# Altium footprint library Footprints_SOC.PcbLib: 201 footprints (part 7 of 13)
Each footprint in its own frame and in the unit in brackets; x right, y up, seen from the top. Pads: shape width x height; smd on the part's side, far side on the other; paste and mask are expansions set on the pad; w line width, h text height; cw(c..) or ccw(c..) is an arc to the next point about the centre after c.
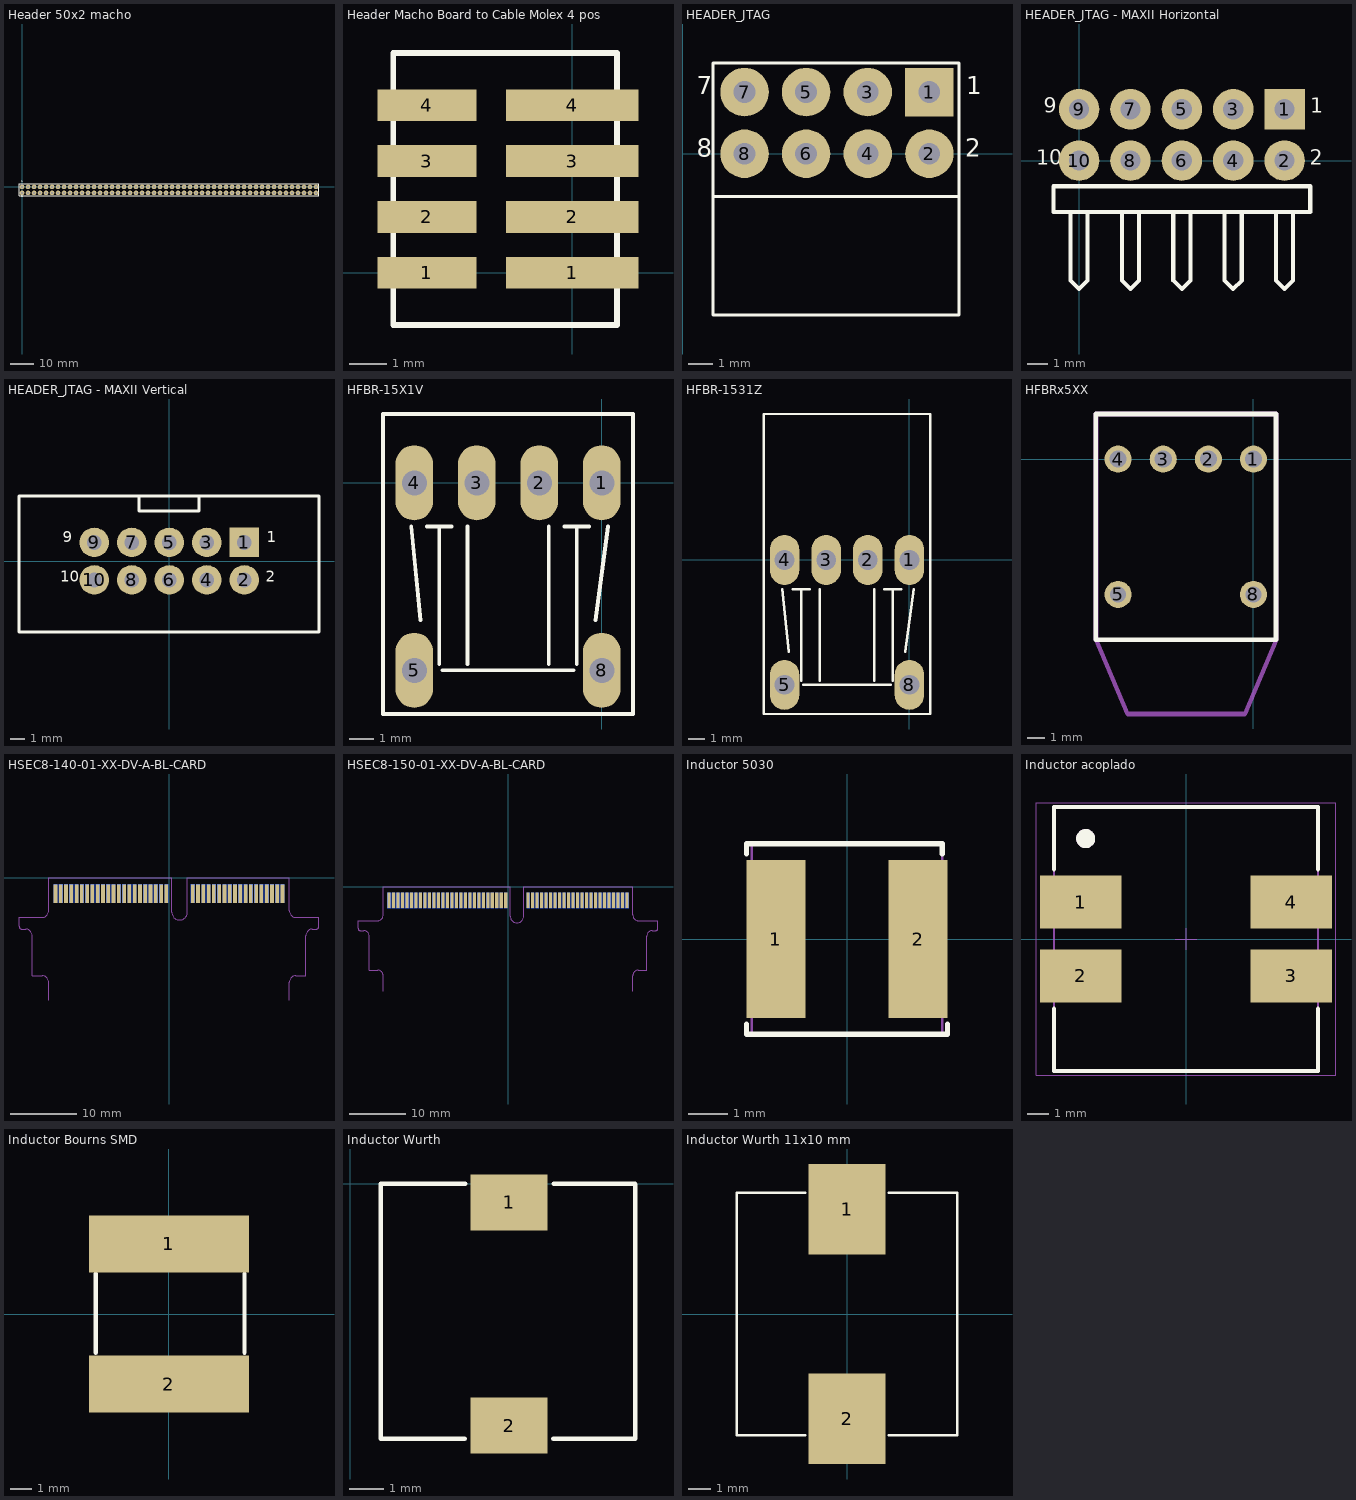
[diagram p6: the footprints below, top view; thin cyan lines are the x and y axes]

## Header 50x2 macho [mm]
pads (100):
  round 2 hole 0.9: 1(0,0) 2(0,-2.54) 3(2.54,0) 4(2.54,-2.54) 5(5.08,0) 6(5.08,-2.54) 7(7.62,0) 8(7.62,-2.54) 9(10.16,0) 10(10.16,-2.54) 11(12.7,0) 12(12.7,-2.54) 13(15.24,0) 14(15.24,-2.54) 15(17.78,0) 16(17.78,-2.54) 17(20.32,0) 18(20.32,-2.54) 19(22.86,0) 20(22.86,-2.54) 21(25.4,0) 22(25.4,-2.54) 23(27.94,0) 24(27.94,-2.54) 25(30.48,0) 26(30.48,-2.54) 27(33.02,0) 28(33.02,-2.54) 29(35.56,0) 30(35.56,-2.54) 31(38.1,0) 32(38.1,-2.54) 33(40.64,0) 34(40.64,-2.54) 35(43.18,0) 36(43.18,-2.54) 37(45.72,0) 38(45.72,-2.54) 39(48.26,0) 40(48.26,-2.54) 41(50.8,0) 42(50.8,-2.54) 43(53.34,0) 44(53.34,-2.54) 45(55.88,0) 46(55.88,-2.54) 47(58.42,0) 48(58.42,-2.54) 49(60.96,0) 50(60.96,-2.54) 51(63.5,0) 52(63.5,-2.54) 53(66.04,0) 54(66.04,-2.54) 55(68.58,0) 56(68.58,-2.54) 57(71.12,0) 58(71.12,-2.54) 59(73.66,0) 60(73.66,-2.54) 61(76.2,0) 62(76.2,-2.54) 63(78.74,0) 64(78.74,-2.54) 65(81.28,0) 66(81.28,-2.54) 67(83.82,0) 68(83.82,-2.54) 69(86.36,0) 70(86.36,-2.54) 71(88.9,0) 72(88.9,-2.54) 73(91.44,0) 74(91.44,-2.54) 75(93.98,0) 76(93.98,-2.54) 77(96.52,0) 78(96.52,-2.54) 79(99.06,0) 80(99.06,-2.54) 81(101.6,0) 82(101.6,-2.54) 83(104.14,0) 84(104.14,-2.54) 85(106.68,0) 86(106.68,-2.54) 87(109.22,0) 88(109.22,-2.54) 89(111.76,0) 90(111.76,-2.54) 91(114.3,0) 92(114.3,-2.54) 93(116.84,0) 94(116.84,-2.54) 95(119.38,0) 96(119.38,-2.54) 97(121.92,0) 98(121.92,-2.54) 99(124.46,0) 100(124.46,-2.54)
Top Overlay:
  lines w0.1: -1.29,-3.74 125.73,-3.74 125.73,1.27 -1.29,1.27 -1.29,-3.74
  text "1" at -0.37,1.45 h1.52
  text "2" at -0.37,-4.79 h1.52
3D body "header 50x2 macho.stp": height 33.53, standoff -2.79, extent -1.28,-3.81 125.72,1.27

## Header Macho Board to Cable Molex 4 pos [mm] "P/N: 0874370443"
pads (8):
  rect 2.65x0.85 smd: 1(-3.9,0) 2(-3.9,1.5) 3(-3.9,3) 4(-3.9,4.5)
  rect 3.55x0.85 smd: 1(0,0) 2(0,1.5) 3(0,3) 4(0,4.5)
Top Overlay:
  lines w0.15: -4.8,-1.4 -4.8,5.9 1.2,5.9 1.2,-1.4 -4.8,-1.4
3D body "874370443.stp": height 5.87, standoff 0.12, extent -4.8,-1.4 1.2,5.9

## HEADER_JTAG [mm] "Connector; Header; 5x2 Position; Right Angle"
pads (8):
  rect 2x2 hole 0.9: 1(10.16,2.54)
  round 2 hole 0.9: 2(10.16,0) 3(7.62,2.54) 4(7.62,0) 5(5.08,2.54) 6(5.08,0) 7(2.54,2.54) 8(2.54,0)
Top Overlay:
  lines w0.127: 1.24,-1.76 11.38,-1.76 ; 1.24,-6.65 1.24,3.73 1.25,3.74 11.38,3.74 11.38,-6.65 1.24,-6.65
  text "8" at 0.58,-0.37 h1.27
  text "7" at 0.58,2.205 h1.27
  text "1" at 11.68,2.2 h1.27
  text "2" at 11.643,-0.37 h1.27
3D body "header 4x2 angulo recto.stp": height 7.18, standoff -5.58, extent 1.24,-6.66 11.4,3.729

## HEADER_JTAG - MAXII Horizontal [mm] "Connector; Header; 5x2 Position; Right Angle"
pads (10):
  rect 2x2 hole 1: 1(10.16,2.54)
  round 2 hole 1: 2(10.16,0) 3(7.62,2.54) 4(7.62,0) 5(5.08,2.54) 6(5.08,0) 7(2.54,2.54) 8(2.54,0) 9(0,2.54) 10(0,0)
Top Overlay:
  lines w0.2: -0.423,-2.54 -0.423,-5.927 0,-6.35 0.423,-5.927 0.423,-2.54 ; 2.117,-2.54 2.117,-5.927 2.54,-6.35 2.963,-5.927 2.963,-2.54 ; 4.657,-2.54 4.657,-5.927 5.08,-6.35 5.503,-5.927 5.503,-2.54 ; 7.197,-2.54 7.197,-5.927 7.62,-6.35 8.043,-5.927 8.043,-2.54 ; 9.737,-2.54 9.737,-5.927 10.16,-6.35 10.583,-5.927 10.583,-2.54 ; -1.27,-2.54 -1.27,-1.27 11.43,-1.27 11.43,-2.54 -1.27,-2.54
  text "10" at -2.13,-0.457 h1.27
  text "9" at -1.744,2.118 h1.27
  text "1" at 11.432,2.125 h1.27
  text "2" at 11.395,-0.457 h1.27
3D body "918143110.stp": height 9.87, standoff -1.97, extent -2.44,-10.644 12.6,2.8

## HEADER_JTAG - MAXII Vertical [mm] "Connector; Header; 5x2 Position"
pads (10):
  rect 2x2 hole 1: 1(5.08,1.27)
  round 2 hole 1: 2(5.08,-1.27) 3(2.54,1.27) 4(2.54,-1.27) 5(0,1.27) 6(0,-1.27) 7(-2.54,1.27) 8(-2.54,-1.27) 9(-5.08,1.27) 10(-5.08,-1.27)
Top Overlay:
  lines w0.2: -2.05,4.417 -2.05,3.4 2.014,3.4 2.014,4.417 ; -10.178,-4.801 -10.178,4.417 10.142,4.417 10.142,-4.801 -10.178,-4.801
  text "10" at -7.38,-1.67 h1.27
  text "9" at -7.2,1 h1.27
  text "1" at 6.62,1.007 h1.27
  text "2" at 6.52,-1.67 h1.27
3D body "Header JTAG CPLD MAXII Vertical.STEP": height 9.41, standoff -2.8, extent -10.178,-4.801 10.142,4.417

## HFBR-15X1V [mil] "Transmisor fibra Optica Horizontal"
pads (6):
  oval 60x120 hole 40: 1(0,0) 2(-100,0) 3(-200,0) 4(-300,0) 5(-300,-300) 8(0,-300)
Top Overlay:
  lines w6: -305,-70 -290,-220 ; -280,-70 -260,-70 ; -260,-290 -260,-70 ; -255,-300 -45,-300 ; -240,-70 -260,-70 ; -215,-290 -215,-70 ; -85,-290 -85,-70 ; -60,-70 -40,-70 ; -40,-290 -40,-70 ; -20,-70 -40,-70 ; -10,-220 10,-70 ; -350,-370 -350,-103.33 -350,110 50,110 50,-370 -5,-370 -295,-370 -350,-370
Mechanical 16:
  lines w6: -295,-340 -295,-260 ; -225,30 -215,30 ; -5,-340 -5,-260
3D body "HFBR2521 (Tx Fibra ootica).STEP": height 300, standoff -124.8, extent -350.31,-630.16 130,110

## HFBR-1531Z [mm] "Emisor fibra optica Vertical"
pads (6):
  oval 1.8x3.048 hole 1.2: 1(0,0) 2(-2.54,0) 3(-5.08,0) 4(-7.62,0) 5(-7.62,-7.62) 8(0,-7.62)
Top Overlay:
  lines w0.152: -7.747,-1.778 -7.366,-5.588 ; -7.112,-1.778 -6.604,-1.778 ; -6.604,-7.366 -6.604,-1.778 ; -6.477,-7.62 -1.143,-7.62 ; -6.096,-1.778 -6.604,-1.778 ; -5.461,-7.366 -5.461,-1.778 ; -2.159,-7.366 -2.159,-1.778 ; -1.524,-1.778 -1.016,-1.778 ; -1.016,-7.366 -1.016,-1.778 ; -0.508,-1.778 -1.016,-1.778 ; -0.254,-5.588 0.254,-1.778 ; -8.89,-9.398 -8.89,-2.625 -8.89,8.9 1.27,8.9 1.27,-9.398 -0.127,-9.398 -7.493,-9.398 -8.89,-9.398
Mechanical 16:
  lines w0.152: -7.493,-8.636 -7.493,-6.604 ; -5.715,0.762 -5.461,0.762 ; -0.127,-8.636 -0.127,-6.604
3D body "HFBR-0500Z Series (Tx Fibr optica Vertical).stp": height 18.8, standoff -3.3, extent -8.988,-9.45 3.202,8.84

## HFBRx5XX [mil]
pads (6):
  round 60 hole 38: 1(0,0) 2(-100,0) 3(-200,0) 4(-300,0)
  round 60 hole 35: 5(-300,-300) 8(0,-300)
Top Overlay:
  lines w10: -350,-400 -350,100 50,100 50,-400 -350,-400
Top Assembly:
  lines w10: -349,-400 -349,100 51,100 51,-400 -19,-565 -279,-565 -349,-400
  text ".Designator" at -352,-201 h40
3D body "Avago HFBR-0500ETZ Series.stp": height 343.94, standoff -100.16, extent -349.96,-610 129.96,130.12

## HSEC8-140-01-XX-DV-A-BL-CARD [mm]
pads (80):
  rect 0.55x2.8 smd far side mask+0.05: 1(-17.2,-2.4) 3(-16.4,-2.4) 5(-15.6,-2.4) 7(-14.8,-2.4) 9(-14,-2.4) 11(-13.2,-2.4) 13(-12.4,-2.4) 15(-11.6,-2.4) 17(-10.8,-2.4) 19(-10,-2.4) 21(-9.2,-2.4) 23(-8.4,-2.4) 25(-7.6,-2.4) 27(-6.8,-2.4) 29(-6,-2.4) 31(-5.2,-2.4) 33(-4.4,-2.4) 35(-3.6,-2.4) 37(-2.8,-2.4) 39(-2,-2.4) 41(-1.2,-2.4) 43(-0.4,-2.4) 45(3.6,-2.4) 47(4.4,-2.4) 49(5.2,-2.4) 51(6,-2.4) 53(6.8,-2.4) 55(7.6,-2.4) 57(8.4,-2.4) 59(9.2,-2.4) 61(10,-2.4) 63(10.8,-2.4) 65(11.6,-2.4) 67(12.4,-2.4) 69(13.2,-2.4) 71(14,-2.4) 73(14.8,-2.4) 75(15.6,-2.4) 77(16.4,-2.4) 79(17.2,-2.4)
  rect 0.55x2.8 smd mask+0.05: 2(-17.2,-2.4) 4(-16.4,-2.4) 6(-15.6,-2.4) 8(-14.8,-2.4) 10(-14,-2.4) 12(-13.2,-2.4) 14(-12.4,-2.4) 16(-11.6,-2.4) 18(-10.8,-2.4) 20(-10,-2.4) 22(-9.2,-2.4) 24(-8.4,-2.4) 26(-7.6,-2.4) 28(-6.8,-2.4) 30(-6,-2.4) 32(-5.2,-2.4) 34(-4.4,-2.4) 36(-3.6,-2.4) 38(-2.8,-2.4) 40(-2,-2.4) 42(-1.2,-2.4) 44(-0.4,-2.4) 46(3.6,-2.4) 48(4.4,-2.4) 50(5.2,-2.4) 52(6,-2.4) 54(6.8,-2.4) 56(7.6,-2.4) 58(8.4,-2.4) 60(9.2,-2.4) 62(10,-2.4) 64(10.8,-2.4) 66(11.6,-2.4) 68(12.4,-2.4) 70(13.2,-2.4) 72(14,-2.4) 74(14.8,-2.4) 76(15.6,-2.4) 78(16.4,-2.4) 80(17.2,-2.4)
Mechanical 16:
  lines w0.025: -18.225,-18.566 -18.225,-15.84 ccw(c-19.225,-15.84) -19.225,-14.84 -20.725,-14.84 -20.725,-8.78 ccw(c-21.725,-8.78) -21.725,-7.78 -22.325,-7.78 cw(c-22.325,-7.38) -22.725,-7.38 -22.725,-6 -19.225,-6 ccw(c-19.225,-5) -18.225,-5 -18.225,-0.779 -18.225,0 0.4,0 0.4,-0.779 0.4,-5.2 ccw(c1.6,-5.2) 2.8,-5.2 2.8,-0.779 2.8,0 18.225,0 18.225,-0.779 18.225,-5 ccw(c19.225,-5) 19.225,-6 22.725,-6 22.725,-7.38 cw(c22.325,-7.38) 22.325,-7.78 21.725,-7.78 ccw(c21.725,-8.78) 20.725,-8.78 20.725,-14.84 19.225,-14.84 ccw(c19.225,-15.84) 18.225,-15.84 18.225,-18.566

## HSEC8-150-01-XX-DV-A-BL-CARD [mm]
pads (100):
  rect 0.55x2.8 smd far side mask+0.05: 1(-21.2,-2.4) 3(-20.4,-2.4) 5(-19.6,-2.4) 7(-18.8,-2.4) 9(-18,-2.4) 11(-17.2,-2.4) 13(-16.4,-2.4) 15(-15.6,-2.4) 17(-14.8,-2.4) 19(-14,-2.4) 21(-13.2,-2.4) 23(-12.4,-2.4) 25(-11.6,-2.4) 27(-10.8,-2.4) 29(-10,-2.4) 31(-9.2,-2.4) 33(-8.4,-2.4) 35(-7.6,-2.4) 37(-6.8,-2.4) 39(-6,-2.4) 41(-5.2,-2.4) 43(-4.4,-2.4) 45(-3.6,-2.4) 47(-2.8,-2.4) 49(-2,-2.4) 51(-1.2,-2.4) 53(-0.4,-2.4) 55(3.6,-2.4) 57(4.4,-2.4) 59(5.2,-2.4) 61(6,-2.4) 63(6.8,-2.4) 65(7.6,-2.4) 67(8.4,-2.4) 69(9.2,-2.4) 71(10,-2.4) 73(10.8,-2.4) 75(11.6,-2.4) 77(12.4,-2.4) 79(13.2,-2.4) 81(14,-2.4) 83(14.8,-2.4) 85(15.6,-2.4) 87(16.4,-2.4) 89(17.2,-2.4) 91(18,-2.4) 93(18.8,-2.4) 95(19.6,-2.4) 97(20.4,-2.4) 99(21.2,-2.4)
  rect 0.55x2.8 smd mask+0.05: 2(-21.2,-2.4) 4(-20.4,-2.4) 6(-19.6,-2.4) 8(-18.8,-2.4) 10(-18,-2.4) 12(-17.2,-2.4) 14(-16.4,-2.4) 16(-15.6,-2.4) 18(-14.8,-2.4) 20(-14,-2.4) 22(-13.2,-2.4) 24(-12.4,-2.4) 26(-11.6,-2.4) 28(-10.8,-2.4) 30(-10,-2.4) 32(-9.2,-2.4) 34(-8.4,-2.4) 36(-7.6,-2.4) 38(-6.8,-2.4) 40(-6,-2.4) 42(-5.2,-2.4) 44(-4.4,-2.4) 46(-3.6,-2.4) 48(-2.8,-2.4) 50(-2,-2.4) 52(-1.2,-2.4) 54(-0.4,-2.4) 56(3.6,-2.4) 58(4.4,-2.4) 60(5.2,-2.4) 62(6,-2.4) 64(6.8,-2.4) 66(7.6,-2.4) 68(8.4,-2.4) 70(9.2,-2.4) 72(10,-2.4) 74(10.8,-2.4) 76(11.6,-2.4) 78(12.4,-2.4) 80(13.2,-2.4) 82(14,-2.4) 84(14.8,-2.4) 86(15.6,-2.4) 88(16.4,-2.4) 90(17.2,-2.4) 92(18,-2.4) 94(18.8,-2.4) 96(19.6,-2.4) 98(20.4,-2.4) 100(21.2,-2.4)
Mechanical 16:
  lines w0.025: -22.225,-18.566 -22.225,-15.84 ccw(c-23.225,-15.84) -23.225,-14.84 -24.725,-14.84 -24.725,-8.78 ccw(c-25.725,-8.78) -25.725,-7.78 -26.325,-7.78 cw(c-26.325,-7.38) -26.725,-7.38 -26.725,-6 -23.225,-6 ccw(c-23.225,-5) -22.225,-5 -22.225,-0.779 -22.225,0 0.4,0 0.4,-0.779 0.4,-5.2 ccw(c1.6,-5.2) 2.8,-5.2 2.8,-0.779 2.8,0 22.225,0 22.225,-0.779 22.225,-5 ccw(c23.225,-5) 23.225,-6 26.725,-6 26.725,-7.38 cw(c26.325,-7.38) 26.325,-7.78 25.725,-7.78 ccw(c25.725,-8.78) 24.725,-8.78 24.725,-14.84 23.225,-14.84 ccw(c23.225,-15.84) 22.225,-15.84 22.225,-18.566

## ID_ProjectRev [mm] "project name + revision number"
Top Overlay:
  text ".ProjectName / .ProjectRevision .Author .Date" at -2.727,-0.335 h2.29

## Inductor 5030 [mm]
pads (2):
  rect 1.5x4 smd: 1(-1.8,0) 2(1.8,0)
Top Overlay:
  lines w0.127: -2.54,-2.159 -2.54,-2.413 2.413,-2.413 2.54,-2.413 2.54,-2.159 ; -2.54,2.159 -2.54,2.413 2.413,2.413 2.413,2.159
Top Assembly:
  lines w0.051: -2.413,-2.413 -2.413,2.413 2.413,2.413 2.413,-2.413 -2.413,-2.413
  text ".Designator" at -1.905,-0.762 h1.52
Mechanical 15:
  lines w0.05: -2.413,-2.413 2.413,-2.413 2.413,2.413 -2.413,2.413 -2.413,-2.413
3D body "Coilcraft-LPS5030.STEP": height 3, standoff 0, extent -2.44,-2.44 2.44,2.44

## Inductor acoplado [mm] "P/N: 744874002 SMT Shielded Coupled Inductor, 4-Leads, body 12.5x12.5mm"
height 8.5
pads (4):
  rect 3.85x2.5 smd: 1(-4.975,1.75) 2(-4.975,-1.75) 3(4.975,-1.75) 4(4.975,1.75)
Top Overlay:
  circle w0.5: c-4.75,4.75 r0.2
  lines w0.2: -6.25,-3.3 -6.25,-6.25 6.25,-6.25 6.25,-3.3 ; -6.25,3.3 -6.25,6.25 6.25,6.25 6.25,3.3
Top Assembly:
  circle w0.5: c-4.75,4.75 r0.2
  lines w0.1: -6.25,-6.25 6.25,-6.25 6.25,6.25 -6.25,6.25 -6.25,-6.25
  text ".Designator" at -4.924,-0.557 h2
Mechanical 15:
  lines w0.05: -0.5,0 0.5,0 ; 0,-0.5 0,0.5 ; -7.1,-6.45 -7.1,6.45 7.1,6.45 7.1,-6.45 -7.1,-6.45
3D body "STEP-WE-DD-1280_CROSSED-rev1.stp": height 8.62, standoff 0.02, extent -6.25,-6.25 6.25,6.25

## Inductor Bourns SMD [mm] "6.8x6.8mm P/N: SRR6038-120Y"
height 4
pads (2):
  rect 7.3x2.6 smd: 1(0,3.2) 2(0,-3.2)
Top Overlay:
  lines w0.2: -3.35,-1.77 -3.35,1.83 ; 3.45,-1.77 3.45,1.83
3D body "Inductor Bourns SMD SRR6038-120Y .stp": height 3.9, standoff 0.1, extent -3.35,-3.27 3.45,3.53

## Inductor Wurth [mm] "SMD Inductor"
pads (2):
  rect 2.2x1.6 smd: 1(4.55,-0.53) 2(4.55,-6.93)
Top Overlay:
  lines w0.127: 3.28,-7.3 0.87,-7.3 0.87,0 3.29,0 ; 5.82,-7.3 8.17,-7.3 8.17,-0.01 ; 5.83,0 8.16,0
3D body "bobina wurth.stp": height 4.55, standoff 0.05, extent 0.87,-7.3 8.17,0

## Inductor Wurth 11x10 mm [mm] "SMD Inductor P/N:74437368100"
pads (2):
  rect 3.5x4.1 smd: 1(0,4.75) 2(0,-4.75)
Top Overlay:
  lines w0.127: -1.9,-5.5 -5,-5.5 -5,5.5 -1.9,5.5 ; 1.9,-5.5 5,-5.5 5,5.5 1.9,5.5
3D body "Inductor Wurth SMD 11x10mm (WE-LHMI-1040-rev1).stp": height 3.8, standoff 0, extent -5,-5.5 5,5.5